# Altium footprint library MyPCB_Homework.PcbLib: 62 footprints (part 3 of 4)
Each footprint in its own frame and in the unit in brackets; x right, y up, seen from the top. Pads: shape width x height; smd on the part's side, far side on the other; paste and mask are expansions set on the pad; w line width, h text height; cw(c..) or ccw(c..) is an arc to the next point about the centre after c.
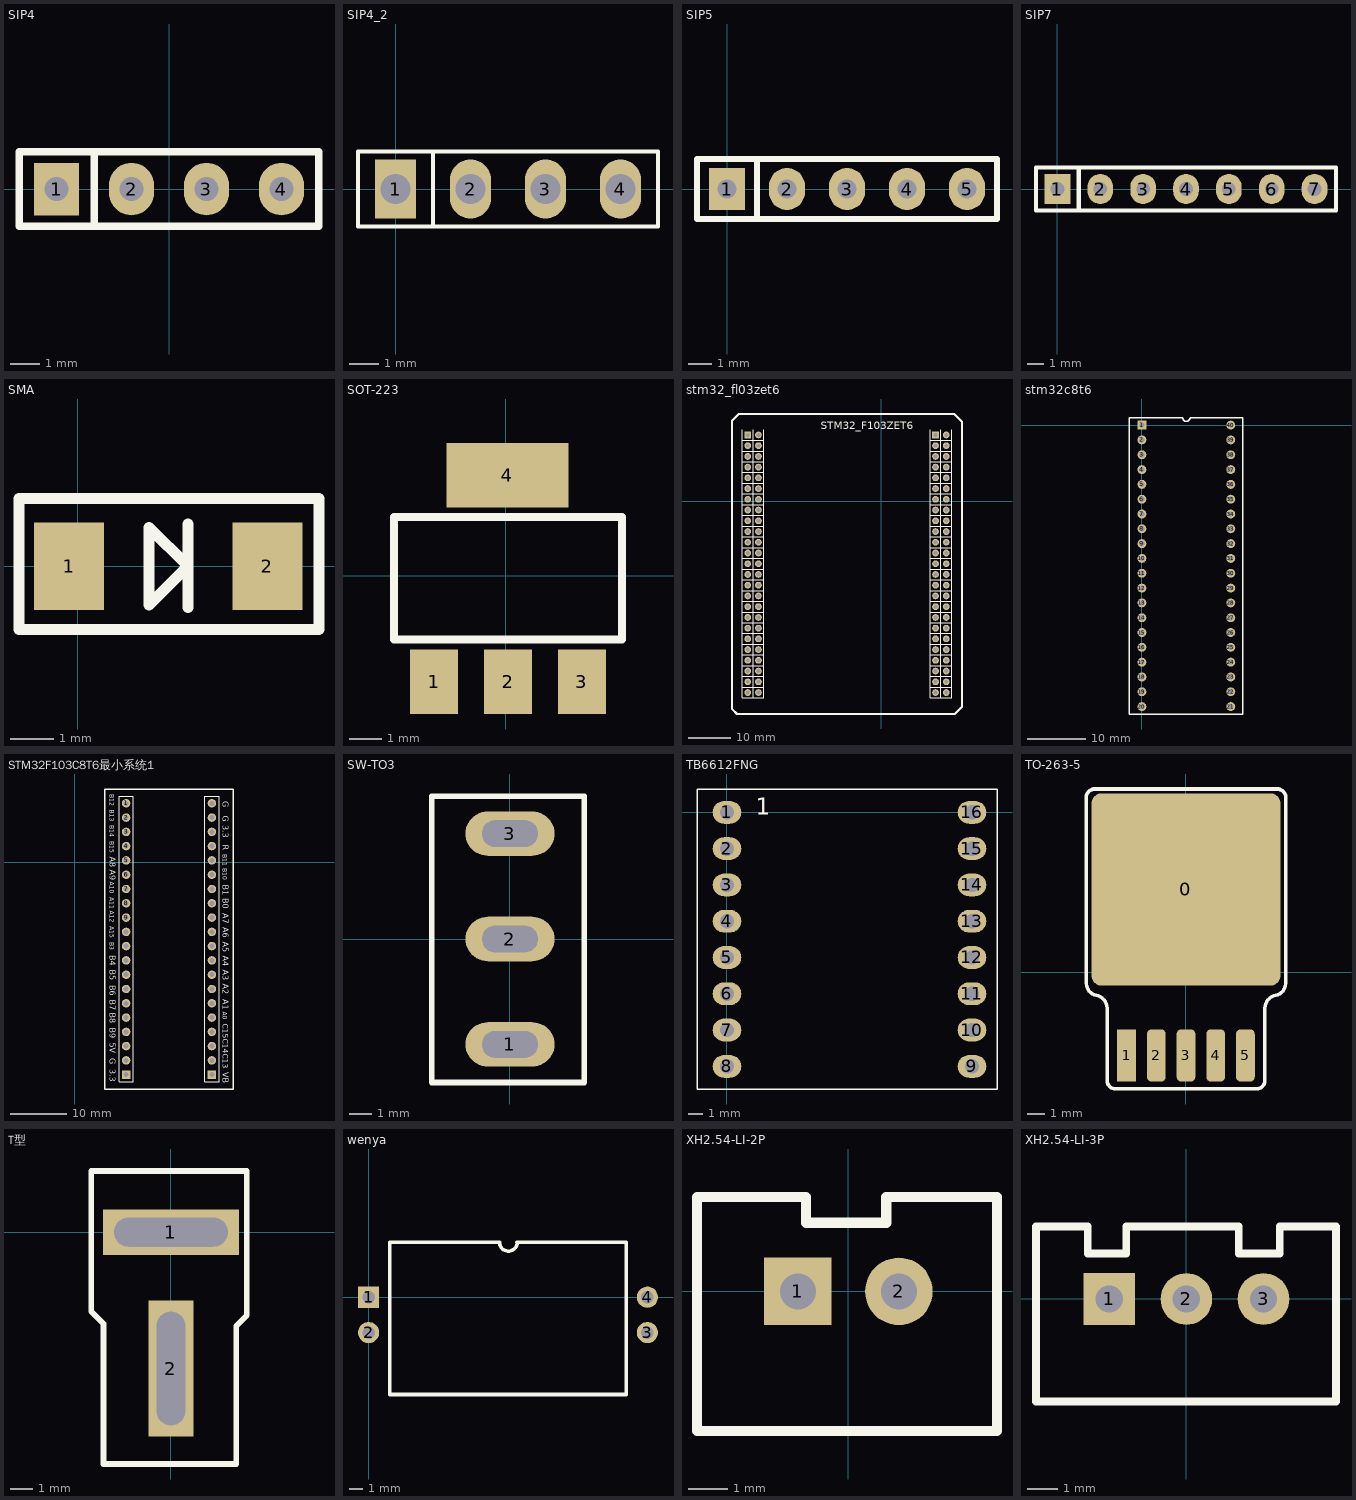
[diagram p2: the footprints below, top view; thin cyan lines are the x and y axes]

## SIP4 [mil]
pads (4):
  rect 60x70 hole 32: 1(-150,0)
  oval 60x70 hole 32: 2(-50,0) 3(50,0) 4(150,0)
Top Overlay:
  lines w10: -100,-50 -100,50 ; -200,-50 -200,50 200,50 200,-50 -200,-50

## SIP4_2 [mm]
pads (4):
  rect 1.4x2 hole 1: 1(0,0)
  oval 1.4x2 hole 1: 2(2.54,0) 3(5.08,0) 4(7.62,0)
Top Overlay:
  lines w0.15: 1.27,-1.27 1.27,1.27 ; -1.27,-1.27 -1.27,1.27 8.89,1.27 8.89,-1.27 -1.27,-1.27
3D body "Samtec-4.step": height 8.89, standoff 0, extent -1.27,-1.27 8.89,1.27

## SIP5 [mil]
pads (5):
  rect 60x70 hole 32: 1(0,0)
  oval 60x70 hole 32: 2(100,0) 3(200,0) 4(300,0) 5(400,0)
Top Overlay:
  lines w10: 50,-50 50,50 ; -50,-50 450,-50 450,50 -50,50 -50,-50

## SIP7 [mil]
pads (7):
  rect 60x70 hole 32: 1(0,0)
  oval 60x70 hole 32: 2(100,0) 3(200,0) 4(300,0) 5(400,0) 6(500,0) 7(600,0)
Top Overlay:
  lines w10: 50,-50 50,50 ; -50,-50 -50,50 650,50 650,-50 -50,-50

## SMA [mil]
pads (2):
  rect 63x78.74 smd: 1(-8,0) 2(170.56,0)
Top Overlay:
  lines w10: 99,-37 99,38 ; -53,-57 -53,61 217,61 217,-57 -53,-57 ; 64,-35 64,35 99,0 64,-35
3D body "DO-214AC.STEP": height 94.49, standoff 0, extent -7.55,-52.15 173.55,54.15

## SOT-223 [mil]
pads (4):
  rect 59x79 smd: 1(-88,-130) 2(2.55,-130) 3(93.1,-130)
  rect 150x79 smd: 4(1.88,123.54)
Top Overlay:
  lines w10: -137.45,-78 142.55,-78 142.55,72 -137.45,72 -137.45,-78
3D body "SOT-223_MP04A.STEP": height 66.93, standoff 0, extent -126.41,-138.72 129.5,135.3

## stm32_fl03zet6 [mm]
pads (100):
  rect 1.6x1.6 hole 0.9: 1(-31.623,15.748) 51(12.827,15.748)
  round 1.6 hole 0.9: 2(-29.083,15.748) 3(-31.623,13.208) 4(-29.083,13.208) 5(-31.623,10.668) 6(-29.083,10.668) 7(-31.623,8.128) 8(-29.083,8.128) 9(-31.623,5.588) 10(-29.083,5.588) 11(-31.623,3.048) 12(-29.083,3.048) 13(-31.623,0.508) 14(-29.083,0.508) 15(-31.623,-2.032) 16(-29.083,-2.032) 17(-31.623,-4.572) 18(-29.083,-4.572) 19(-31.623,-7.112) 20(-29.083,-7.112) 21(-31.623,-9.652) 22(-29.083,-9.652) 23(-31.623,-12.192) 24(-29.083,-12.192) 25(-31.623,-14.732) 26(-29.083,-14.732) 27(-31.623,-17.272) 28(-29.083,-17.272) 29(-31.623,-19.812) 30(-29.083,-19.812) 31(-31.623,-22.352) 32(-29.083,-22.352) 33(-31.623,-24.892) 34(-29.083,-24.892) 35(-31.623,-27.432) 36(-29.083,-27.432) 37(-31.623,-29.972) 38(-29.083,-29.972) 39(-31.623,-32.512) 40(-29.083,-32.512) 41(-31.623,-35.052) 42(-29.083,-35.052) 43(-31.623,-37.592) 44(-29.083,-37.592) 45(-31.623,-40.132) 46(-29.083,-40.132) 47(-31.623,-42.672) 48(-29.083,-42.672) 49(-31.623,-45.212) 50(-29.083,-45.212) 52(15.367,15.748) 53(12.827,13.208) 54(15.367,13.208) 55(12.827,10.668) 56(15.367,10.668) 57(12.827,8.128) 58(15.367,8.128) 59(12.827,5.588) 60(15.367,5.588) 61(12.827,3.048) 62(15.367,3.048) 63(12.827,0.508) 64(15.367,0.508) 65(12.827,-2.032) 66(15.367,-2.032) 67(12.827,-4.572) 68(15.367,-4.572) 69(12.827,-7.112) 70(15.367,-7.112) 71(12.827,-9.652) 72(15.367,-9.652) 73(12.827,-12.192) 74(15.367,-12.192) 75(12.827,-14.732) 76(15.367,-14.732) 77(12.827,-17.272) 78(15.367,-17.272) 79(12.827,-19.812) 80(15.367,-19.812) 81(12.827,-22.352) 82(15.367,-22.352) 83(12.827,-24.892) 84(15.367,-24.892) 85(12.827,-27.432) 86(15.367,-27.432) 87(12.827,-29.972) 88(15.367,-29.972) 89(12.827,-32.512) 90(15.367,-32.512) 91(12.827,-35.052) 92(15.367,-35.052) 93(12.827,-37.592) 94(15.367,-37.592) 95(12.827,-40.132) 96(15.367,-40.132) 97(12.827,-42.672) 98(15.367,-42.672) 99(12.827,-45.212) 100(15.367,-45.212)
Top Overlay:
  lines w0.2: -32.893,-46.482 -32.893,17.018 ; -27.813,-46.482 -27.813,17.018 ; 11.557,-46.482 11.557,17.018 ; 16.637,-46.482 16.637,17.018
  lines w0.203: -32.893,-46.482 -27.813,-46.482 ; -32.893,-43.942 -27.813,-43.942 ; -32.893,-41.402 -27.813,-41.402 ; -32.893,-38.862 -27.813,-38.862 ; -32.893,-36.322 -27.813,-36.322 ; -32.893,-33.782 -27.813,-33.782 ; -32.893,-31.242 -27.813,-31.242 ; -32.893,-28.702 -27.813,-28.702 ; -32.893,-26.162 -27.813,-26.162 ; -32.893,-23.622 -27.813,-23.622 ; -32.893,-21.082 -27.813,-21.082 ; -32.893,-18.542 -27.813,-18.542 ; -32.893,-16.002 -27.813,-16.002 ; -32.893,-13.462 -27.813,-13.462 ; -32.893,-10.922 -27.813,-10.922 ; -32.893,-8.382 -27.813,-8.382 ; -32.893,-5.842 -27.813,-5.842 ; -32.893,-3.302 -27.813,-3.302 ; -32.893,-0.762 -27.813,-0.762 ; -32.893,1.778 -27.813,1.778 ; -32.893,4.318 -27.813,4.318 ; -32.893,6.858 -27.813,6.858 ; -32.893,9.398 -27.813,9.398 ; -32.893,11.938 -27.813,11.938 ; -32.893,14.478 -27.813,14.478 ; -30.353,-46.482 -30.353,17.018 ; 11.557,-46.482 16.637,-46.482 ; 11.557,-43.942 16.637,-43.942 ; 11.557,-41.402 16.637,-41.402 ; 11.557,-38.862 16.637,-38.862 ; 11.557,-36.322 16.637,-36.322 ; 11.557,-33.782 16.637,-33.782 ; 11.557,-31.242 16.637,-31.242 ; 11.557,-28.702 16.637,-28.702 ; 11.557,-26.162 16.637,-26.162 ; 11.557,-23.622 16.637,-23.622 ; 11.557,-21.082 16.637,-21.082 ; 11.557,-18.542 16.637,-18.542 ; 11.557,-16.002 16.637,-16.002 ; 11.557,-13.462 16.637,-13.462 ; 11.557,-10.922 16.637,-10.922 ; 11.557,-8.382 16.637,-8.382 ; 11.557,-5.842 16.637,-5.842 ; 11.557,-3.302 16.637,-3.302 ; 11.557,-0.762 16.637,-0.762 ; 11.557,1.778 16.637,1.778 ; 11.557,4.318 16.637,4.318 ; 11.557,6.858 16.637,6.858 ; 11.557,9.398 16.637,9.398 ; 11.557,11.938 16.637,11.938 ; 11.557,14.478 16.637,14.478 ; 14.097,-46.482 14.097,17.018
  lines w0.508: 19.05,16.637 19.05,18.923 17.272,20.701 -33.782,20.701 -35.306,19.177 -35.306,-49.149 -34.163,-50.292 17.399,-50.292 19.05,-48.641 19.05,16.891
  text "STM32_F103ZET6" at -14.351,16.51 h3.05
3D body "HDR2.54-1x2P.STEP": height 8.5, standoff -3, extent -32.893,4.318 -27.813,6.858
3D body "HDR2.54-1x2P.STEP": height 8.5, standoff -3, extent -32.893,11.938 -27.813,14.478
3D body "HDR2.54-1x2P.STEP": height 8.5, standoff -3, extent -32.893,14.478 -27.813,17.018
3D body "HDR2.54-1x2P.STEP": height 8.5, standoff -3, extent -32.893,6.858 -27.813,9.398
3D body "HDR2.54-1x2P.STEP": height 8.5, standoff -3, extent -32.893,9.398 -27.813,11.938
3D body "HDR2.54-1x2P.STEP": height 8.5, standoff -3, extent -32.893,-8.382 -27.813,-5.842
3D body "HDR2.54-1x2P.STEP": height 8.5, standoff -3, extent -32.893,-0.762 -27.813,1.778
3D body "HDR2.54-1x2P.STEP": height 8.5, standoff -3, extent -32.893,1.778 -27.813,4.318
3D body "HDR2.54-1x2P.STEP": height 8.5, standoff -3, extent -32.893,-5.842 -27.813,-3.302
3D body "HDR2.54-1x2P.STEP": height 8.5, standoff -3, extent -32.893,-3.302 -27.813,-0.762
3D body "HDR2.54-1x2P.STEP": height 8.5, standoff -3, extent -32.893,-21.082 -27.813,-18.542
3D body "HDR2.54-1x2P.STEP": height 8.5, standoff -3, extent -32.893,-13.462 -27.813,-10.922
3D body "HDR2.54-1x2P.STEP": height 8.5, standoff -3, extent -32.893,-10.922 -27.813,-8.382
3D body "HDR2.54-1x2P.STEP": height 8.5, standoff -3, extent -32.893,-18.542 -27.813,-16.002
3D body "HDR2.54-1x2P.STEP": height 8.5, standoff -3, extent -32.893,-16.002 -27.813,-13.462
3D body "HDR2.54-1x2P.STEP": height 8.5, standoff -3, extent -32.893,-33.782 -27.813,-31.242
3D body "HDR2.54-1x2P.STEP": height 8.5, standoff -3, extent -32.893,-26.162 -27.813,-23.622
3D body "HDR2.54-1x2P.STEP": height 8.5, standoff -3, extent -32.893,-23.622 -27.813,-21.082
3D body "HDR2.54-1x2P.STEP": height 8.5, standoff -3, extent -32.893,-31.242 -27.813,-28.702
3D body "HDR2.54-1x2P.STEP": height 8.5, standoff -3, extent -32.893,-28.702 -27.813,-26.162
3D body "HDR2.54-1x2P.STEP": height 8.5, standoff -3, extent -32.893,-46.482 -27.813,-43.942
3D body "HDR2.54-1x2P.STEP": height 8.5, standoff -3, extent -32.893,-38.862 -27.813,-36.322
3D body "HDR2.54-1x2P.STEP": height 8.5, standoff -3, extent -32.893,-41.402 -27.813,-38.862
3D body "HDR2.54-1x2P.STEP": height 8.5, standoff -3, extent -32.893,-36.322 -27.813,-33.782
3D body "HDR2.54-1x2P.STEP": height 8.5, standoff -3, extent -32.893,-43.942 -27.813,-41.402
3D body "HDR2.54-1x2P.STEP": height 8.5, standoff -3, extent 11.557,4.318 16.637,6.858
3D body "HDR2.54-1x2P.STEP": height 8.5, standoff -3, extent 11.557,11.938 16.637,14.478
3D body "HDR2.54-1x2P.STEP": height 8.5, standoff -3, extent 11.557,14.478 16.637,17.018
3D body "HDR2.54-1x2P.STEP": height 8.5, standoff -3, extent 11.557,6.858 16.637,9.398
3D body "HDR2.54-1x2P.STEP": height 8.5, standoff -3, extent 11.557,9.398 16.637,11.938
3D body "HDR2.54-1x2P.STEP": height 8.5, standoff -3, extent 11.557,-8.382 16.637,-5.842
3D body "HDR2.54-1x2P.STEP": height 8.5, standoff -3, extent 11.557,-0.762 16.637,1.778
3D body "HDR2.54-1x2P.STEP": height 8.5, standoff -3, extent 11.557,1.778 16.637,4.318
3D body "HDR2.54-1x2P.STEP": height 8.5, standoff -3, extent 11.557,-5.842 16.637,-3.302
3D body "HDR2.54-1x2P.STEP": height 8.5, standoff -3, extent 11.557,-3.302 16.637,-0.762
3D body "HDR2.54-1x2P.STEP": height 8.5, standoff -3, extent 11.557,-21.082 16.637,-18.542
3D body "HDR2.54-1x2P.STEP": height 8.5, standoff -3, extent 11.557,-13.462 16.637,-10.922
3D body "HDR2.54-1x2P.STEP": height 8.5, standoff -3, extent 11.557,-10.922 16.637,-8.382
3D body "HDR2.54-1x2P.STEP": height 8.5, standoff -3, extent 11.557,-18.542 16.637,-16.002
3D body "HDR2.54-1x2P.STEP": height 8.5, standoff -3, extent 11.557,-16.002 16.637,-13.462
3D body "HDR2.54-1x2P.STEP": height 8.5, standoff -3, extent 11.557,-33.782 16.637,-31.242
3D body "HDR2.54-1x2P.STEP": height 8.5, standoff -3, extent 11.557,-26.162 16.637,-23.622
3D body "HDR2.54-1x2P.STEP": height 8.5, standoff -3, extent 11.557,-23.622 16.637,-21.082
3D body "HDR2.54-1x2P.STEP": height 8.5, standoff -3, extent 11.557,-31.242 16.637,-28.702
3D body "HDR2.54-1x2P.STEP": height 8.5, standoff -3, extent 11.557,-28.702 16.637,-26.162
3D body "HDR2.54-1x2P.STEP": height 8.5, standoff -3, extent 11.557,-46.482 16.637,-43.942
3D body "HDR2.54-1x2P.STEP": height 8.5, standoff -3, extent 11.557,-38.862 16.637,-36.322
3D body "HDR2.54-1x2P.STEP": height 8.5, standoff -3, extent 11.557,-41.402 16.637,-38.862
3D body "HDR2.54-1x2P.STEP": height 8.5, standoff -3, extent 11.557,-36.322 16.637,-33.782
3D body "HDR2.54-1x2P.STEP": height 8.5, standoff -3, extent 11.557,-43.942 16.637,-41.402

## stm32c8t6 [mil]
pads (40):
  rect 60x60 hole 35: 1(0,0)
  round 60 hole 35: 2(0,-100) 3(0,-200) 4(0,-300) 5(0,-400) 6(0,-500) 7(0,-600) 8(0,-700) 9(0,-800) 10(0,-900) 11(0,-1000) 12(0,-1100) 13(0,-1200) 14(0,-1300) 15(0,-1400) 16(0,-1500) 17(0,-1600) 18(0,-1700) 19(0,-1800) 20(0,-1900) 21(600,-1900) 22(600,-1800) 23(600,-1700) 24(600,-1600) 25(600,-1500) 26(600,-1400) 27(600,-1300) 28(600,-1200) 29(600,-1100) 30(600,-1000) 31(600,-900) 32(600,-800) 33(600,-700) 34(600,-600) 35(600,-500) 36(600,-400) 37(600,-300) 38(600,-200) 39(600,-100) 40(600,0)
Top Overlay:
  lines w10: -85,-1950 -85,50 275,50 ccw(c300,50) 325,50 680,50 680,-1950 -85,-1950

## STM32F103C8T6最小系统1 [mm]
pads (40):
  round 1.5 hole 0.9: 1(9.144,10.515) 2(9.144,7.975) 3(9.144,5.435) 4(9.144,2.895) 5(9.144,0.355) 6(9.144,-2.185) 7(9.144,-4.725) 8(9.144,-7.265) 9(9.144,-9.805) 10(9.144,-12.345) 11(9.144,-14.885) 12(9.144,-17.425) 13(9.144,-19.965) 14(9.144,-22.505) 15(9.144,-25.045) 16(9.144,-27.585) 17(9.144,-30.125) 18(9.144,-32.665) 19(9.144,-35.205) 22(24.384,-35.205) 23(24.384,-32.665) 24(24.384,-30.125) 25(24.384,-27.585) 26(24.384,-25.045) 27(24.384,-22.505) 28(24.384,-19.965) 29(24.384,-17.425) 30(24.384,-14.885) 31(24.384,-12.345) 32(24.384,-9.805) 33(24.384,-7.265) 34(24.384,-4.725) 35(24.384,-2.185) 36(24.384,0.355) 37(24.384,2.895) 38(24.384,5.435) 39(24.384,7.975) 40(24.384,10.515)
  rect 1.5x1.5 hole 0.9: 20(9.144,-37.745) 21(24.384,-37.745)
Top Overlay:
  lines w0.2: 7.874,-39.015 10.414,-39.015 10.414,11.785 7.874,11.785 7.874,-37.11 7.874,-39.015 ; 23.114,-39.015 25.654,-39.015 25.654,11.785 23.114,11.785 23.114,-37.11 23.114,-39.015
  lines w0.254: 5.334,-40.285 5.334,13.055 28.194,13.055 28.194,-40.241 28.194,-40.285 5.334,-40.285
  text "R" at 26.34,3.149 h1.02
  text "B11" at 26.34,1.473 h0.8
  text "B10" at 26.34,-1.042 h0.8
  text "B1" at 26.34,-3.963 h1.02
  text "B0" at 26.34,-6.376 h1.02
  text "A0" at 26.34,-26.569 h0.8
  text "A1" at 26.34,-24.308 h1.02
  text "A2" at 26.34,-21.598 h1.02
  text "A3" at 26.34,-19.112 h1.02
  text "A4" at 26.34,-16.587 h1.02
  text "A5" at 26.34,-14.098 h1.02
  text "A6" at 26.34,-11.532 h1.02
  text "C15C14C13" at 26.34,-28.652 h1
  text "A7" at 26.34,-8.992 h1.02
  text "VB" at 26.34,-37.262 h1.02
  text "3.3" at 26.34,6.578 h1.02
  text "G" at 26.34,8.331 h1.02
  text "G" at 26.34,10.871 h1.02
  text "B12" at 6.223,12.166 h0.8
  text "B13" at 6.223,9.372 h0.8
  text "B14" at 6.223,6.578 h0.8
  text "B15" at 6.223,3.784 h0.8
  text "A8" at 6.223,0.99 h1.02
  text "A9" at 6.223,-1.296 h1.02
  text "A10" at 6.223,-3.455 h0.8
  text "A11" at 6.223,-6.198 h0.8
  text "A12" at 6.223,-8.611 h0.8
  text "A15" at 6.223,-11.354 h0.8
  text "B3" at 6.223,-14.199 h0.8
  text "B4" at 6.223,-16.536 h1.02
  text "B5" at 6.223,-19.076 h1.02
  text "B6" at 6.223,-21.87 h1.02
  text "B7" at 6.223,-24.41 h1.02
  text "B8" at 6.223,-26.696 h1.02
  text "B9" at 6.223,-29.363 h1.02
  text "5V" at 6.223,-32.03 h1.02
  text "G" at 6.223,-34.824 h1.02
  text "3.3" at 6.223,-36.729 h1.02
3D body "STM32F103C8T6核心板.step": height 11.64, standoff -5.89, extent 5.305,-43.997 28.165,13.044

## SW-TO3 [mm]
pads (3):
  oval 4x2 hole 1.2 slot 2.5 at 0 deg: 1(0,-4.724) 2(0,0) 3(0,4.724)
Top Overlay:
  lines w0.254: -3.504,-6.433 3.329,-6.433 3.329,6.394 -3.504,6.394 -3.504,-6.433
3D body "7101SYZBE CK switch.step": height 28.55, standoff -3.83, extent -3.43,-6.363 3.43,6.35

## TB6612FNG [mm]
pads (16):
  oval 2x1.6 hole 1: 1(0,0) 2(0,-2.54) 3(0,-5.08) 4(0,-7.62) 5(0,-10.16) 6(0,-12.7) 7(0,-15.24) 8(0,-17.78) 9(17.15,-17.78) 10(17.15,-15.24) 11(17.15,-12.7) 12(17.15,-10.16) 13(17.15,-7.62) 14(17.15,-5.08) 15(17.15,-2.54) 16(17.15,0)
Top Overlay:
  lines w0.1: -2.098,-19.367 18.902,-19.367 18.902,1.633 -2.098,1.633 -2.098,-19.367
  text "1" at 2.007,-0.564 h2
3D body "User Library-Motor Driver.step": height 6.54, standoff 2.97, extent -2.197,-19.634 18.707,1.346

## TO-263-5 [mm]
pads (6):
  rrect10% 10.8x11 smd: 0(0,4.75)
  rect 1.07x3 smd: 1(-3.4,-4.75)
  rrect50% 1.07x3 smd: 2(-1.7,-4.75) 3(0,-4.75) 4(1.7,-4.75) 5(3.4,-4.75)
Top Overlay:
  lines w0.2: -4.512,-6.122 ccw(c-4.028,-6.181) -4.125,-6.659 ; 4.125,-6.659 ccw(c4.028,-6.181) 4.512,-6.122
  lines w0.203: -5.7,10.05 -5.7,-0.53 ccw(c-5.005,-0.615) -5.145,-1.301 cw(c-5.306,-2.084) -4.512,-2.181 -4.512,-6.122 ; -5.7,10.109 cw(c-5.222,10.011) -5.299,10.493 ; -5.3,10.5 5.3,10.5 ; -4.125,-6.659 4.125,-6.659 ; 4.512,-6.122 4.512,-2.181 cw(c5.306,-2.084) 5.145,-1.301 ccw(c5.005,-0.615) 5.7,-0.53 5.7,10.05 ; 5.299,10.493 cw(c5.222,10.011) 5.7,10.109
3D body "SW3dPS-LTC DD-PAK.STEP": height 4.48, standoff 0, extent -5.137,-4.801 5.087,9.55

## T型 [mm]
pads (2):
  rect 6x2 hole 1.27 slot 5 at 0 deg: 1(0,0)
  rect 2x6 hole 1.27 slot 5 at 90 deg: 2(0,-6)
Top Overlay:
  lines w0.254: -3.504,-3.496 -2.972,-4.028 -2.972,-10.2 1.098,-10.2 2.87,-10.2 2.87,-4.13 3.329,-3.671 3.329,2.694 -3.504,2.694 -3.504,-2.405 -3.504,-3.496

## wenya [mil]
pads (4):
  rect 60x60 hole 35: 1(0,0)
  round 60 hole 35: 2(0,-100) 3(788,-100) 4(788,0)
Top Overlay:
  lines w10: 369,155 60,155 60,-275 728,-275 728,155 419,155 ; 370,155 ccw(c395,155) 420,155

## XH2.54-LI-2P [mm] "接插件，2P"
pads (2):
  rect 1.7x1.7 hole 0.9: 1(-1.27,0)
  round 1.7 hole 0.9: 2(1.27,0)
Top Overlay:
  lines w0.254: -3.807,-3.505 -3.807,2.37 -1.067,2.37 -1.067,1.727 0.953,1.727 0.953,2.37 2.954,2.37 3.736,2.37 3.736,-3.505 -3.807,-3.505
3D body "XH2.54-2P.STEP": height 7.05, standoff -2.45, extent -3.77,-3.3 3.77,2.4

## XH2.54-LI-3P [mm] "接插件，3P"
pads (3):
  rect 1.7x1.7 hole 0.9: 1(-2.54,0)
  round 1.7 hole 0.9: 2(0,0) 3(2.54,0)
Top Overlay:
  lines w0.254: -4.953,-3.378 4.928,-3.378 4.928,2.388 3.073,2.388 3.073,1.5 1.727,1.5 1.727,2.388 -1.981,2.388 -1.981,1.5 -3.251,1.5 -3.251,2.388 -4.953,2.388 -4.953,-3.378
3D body "XH2.54-3P.STEP": height 7.03, standoff -2.47, extent -5.04,-3.3 5.04,2.4